# Altium schematic symbol library Regulator_Switching.SchLib: 1070 symbols (part 8 of 9)
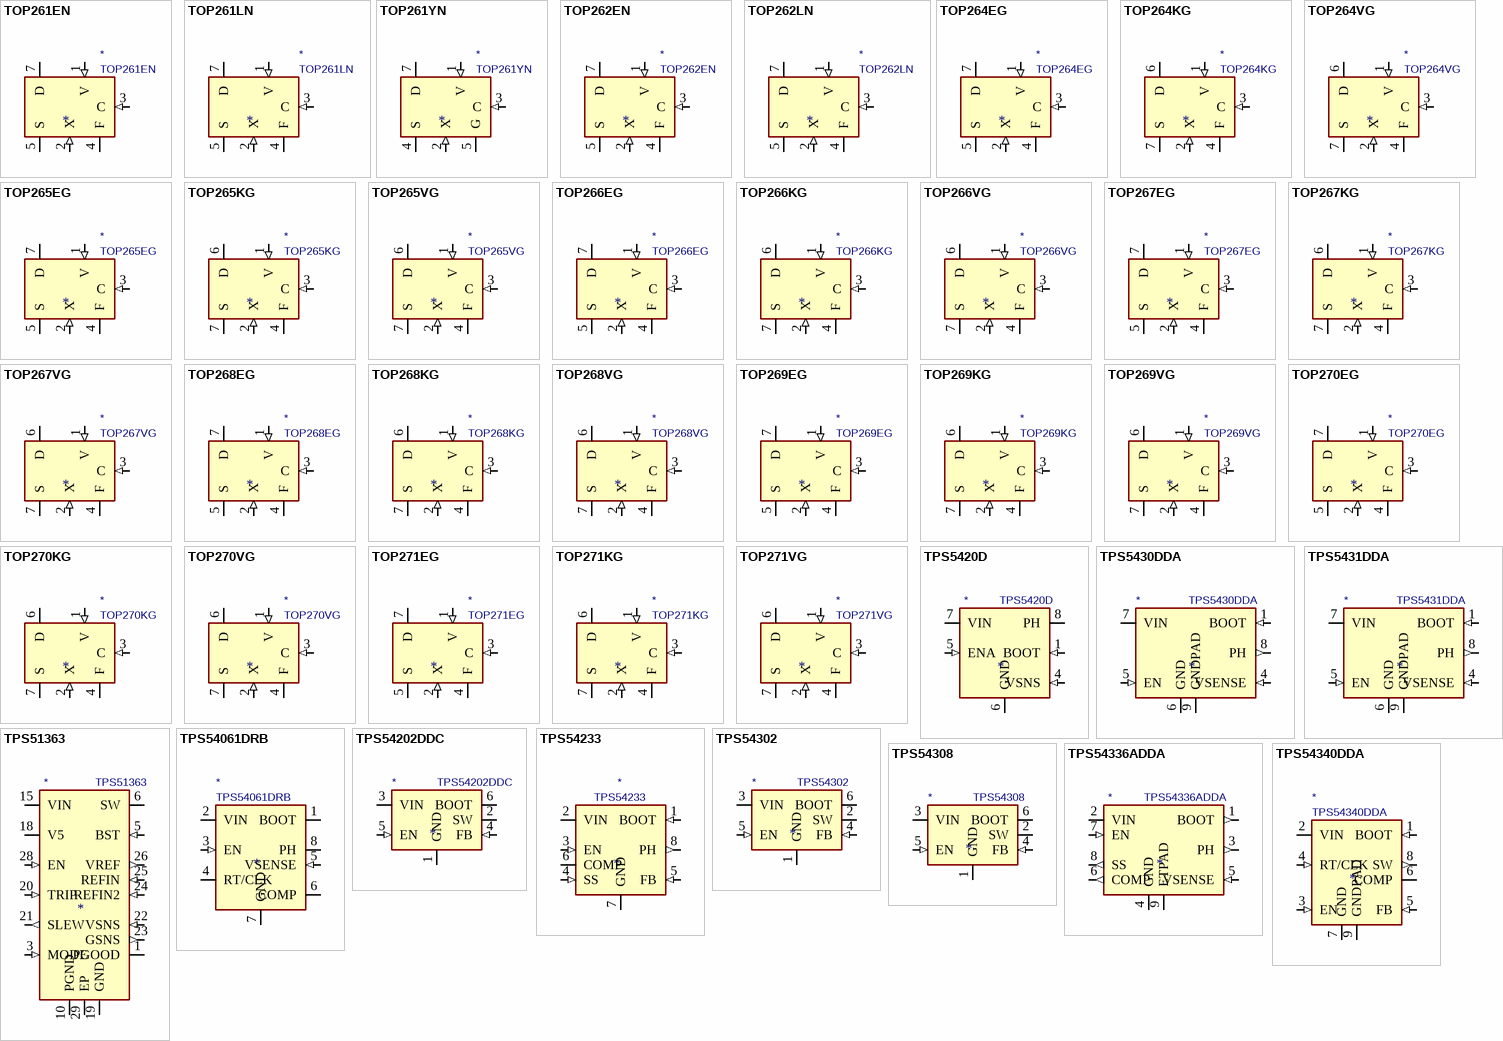
[diagram p33: symbols TOP261EN to TPS54340DDA]

## TOP262EN
designator *  value TOP262EN
ki_keywords: Eco Smart Off-Line Switcher, Extendend Power Range; ki_description: TOPSwitch-HX Family, 254W Output Power; ki_fp_filters: PowerIntegrations?eSIP?7C*; Footprint: Package_SIP:PowerIntegrations_eSIP-7C; Supplier: https://ac-dc.power.com/sites/default/files/product-docs/topswitch-hx_family_datasheet.pdf
footprint PowerIntegrations_eSIP-7C
pins: 1 V (in), 2 X (in), 3 C (in), 4 F, 5 S (power), 7 D (oc)

## TOP262LN
designator *  value TOP262LN
ki_keywords: Eco Smart Off-Line Switcher, Extendend Power Range; ki_description: TOPSwitch-HX Family, 177W Output Power; ki_fp_filters: PowerIntegrations?eSIP?7F*; Footprint: Package_SIP:PowerIntegrations_eSIP-7F; Supplier: https://ac-dc.power.com/sites/default/files/product-docs/topswitch-hx_family_datasheet.pdf
footprint PowerIntegrations_eSIP-7F
pins: 1 V (in), 2 X (in), 3 C (in), 4 F, 5 S (power), 7 D (oc)

## TOP264EG
designator *  value TOP264EG
ki_keywords: Integrated Off-Line Switcher with EcoSmart™ Technology; ki_description: TOPSwitch-JX Family, 43W Output Power, eSIP-7C; ki_fp_filters: PowerIntegrations?eSIP?7C*; Footprint: Package_SIP:PowerIntegrations_eSIP-7C; Supplier: https://ac-dc.power.com/sites/default/files/product-docs/topswitch-jx_family_datasheet.pdf
footprint PowerIntegrations_eSIP-7C
pins: 1 V (in), 2 X (in), 3 C (in), 4 F, 5 S (power), 7 D (oc)

## TOP264KG
designator *  value TOP264KG
ki_keywords: Integrated Off-Line Switcher with EcoSmart™ Technology; ki_description: TOPSwitch-JX Family, 30W Output Power, eSOP-12B; ki_fp_filters: PowerIntegrations?eSOP?12B*; Footprint: Package_SO:PowerIntegrations_eSOP-12B; Supplier: https://ac-dc.power.com/sites/default/files/product-docs/topswitch-jx_family_datasheet.pdf
footprint PowerIntegrations_eSOP-12B
pins: 1 V (in), 2 X (in), 3 C (in), 4 F, 6 D (oc), 7 S (power), 8 S hidden, 9 S hidden, 10 S hidden, 11 S hidden, 12 S hidden

## TOP264VG
designator *  value TOP264VG
ki_keywords: Integrated Off-Line Switcher with EcoSmart™ Technology; ki_description: TOPSwitch-JX Family, 43W Output Power, eDIP-12B; ki_fp_filters: PowerIntegrations?eDIP?12*; Footprint: Package_DIP:PowerIntegrations_eDIP-12B; Supplier: https://ac-dc.power.com/sites/default/files/product-docs/topswitch-jx_family_datasheet.pdf
footprint PowerIntegrations_eDIP-12B
pins: 1 V (in), 2 X (in), 3 C (in), 4 F, 6 D (oc), 7 S (power), 8 S hidden, 9 S hidden, 10 S hidden, 11 S hidden, 12 S hidden

## TOP265EG
designator *  value TOP265EG
ki_keywords: Integrated Off-Line Switcher with EcoSmart™ Technology; ki_description: TOPSwitch-JX Family, 57W Output Power, eSIP-7C; ki_fp_filters: PowerIntegrations?eSIP?7C*; Footprint: Package_SIP:PowerIntegrations_eSIP-7C; Supplier: https://ac-dc.power.com/sites/default/files/product-docs/topswitch-jx_family_datasheet.pdf
footprint PowerIntegrations_eSIP-7C
pins: 1 V (in), 2 X (in), 3 C (in), 4 F, 5 S (power), 7 D (oc)

## TOP265KG
designator *  value TOP265KG
ki_keywords: Integrated Off-Line Switcher with EcoSmart™ Technology; ki_description: TOPSwitch-JX Family, 34W Output Power, eSOP-12B; ki_fp_filters: PowerIntegrations?eSOP?12B*; Footprint: Package_SO:PowerIntegrations_eSOP-12B; Supplier: https://ac-dc.power.com/sites/default/files/product-docs/topswitch-jx_family_datasheet.pdf
footprint PowerIntegrations_eSOP-12B
pins: 1 V (in), 2 X (in), 3 C (in), 4 F, 6 D (oc), 7 S (power), 8 S hidden, 9 S hidden, 10 S hidden, 11 S hidden, 12 S hidden

## TOP265VG
designator *  value TOP265VG
ki_keywords: Integrated Off-Line Switcher with EcoSmart™ Technology; ki_description: TOPSwitch-JX Family, 57W Output Power, eDIP-12B; ki_fp_filters: PowerIntegrations?eDIP?12*; Footprint: Package_DIP:PowerIntegrations_eDIP-12B; Supplier: https://ac-dc.power.com/sites/default/files/product-docs/topswitch-jx_family_datasheet.pdf
footprint PowerIntegrations_eDIP-12B
pins: 1 V (in), 2 X (in), 3 C (in), 4 F, 6 D (oc), 7 S (power), 8 S hidden, 9 S hidden, 10 S hidden, 11 S hidden, 12 S hidden

## TOP266EG
designator *  value TOP266EG
ki_keywords: Integrated Off-Line Switcher with EcoSmart™ Technology; ki_description: TOPSwitch-JX Family, 86W Output Power, eSIP-7C; ki_fp_filters: PowerIntegrations?eSIP?7C*; Footprint: Package_SIP:PowerIntegrations_eSIP-7C; Supplier: https://ac-dc.power.com/sites/default/files/product-docs/topswitch-jx_family_datasheet.pdf
footprint PowerIntegrations_eSIP-7C
pins: 1 V (in), 2 X (in), 3 C (in), 4 F, 5 S (power), 7 D (oc)

## TOP266KG
designator *  value TOP266KG
ki_keywords: Integrated Off-Line Switcher with EcoSmart™ Technology; ki_description: TOPSwitch-JX Family, 39W Output Power, eSOP-12B; ki_fp_filters: PowerIntegrations?eSOP?12B*; Footprint: Package_SO:PowerIntegrations_eSOP-12B; Supplier: https://ac-dc.power.com/sites/default/files/product-docs/topswitch-jx_family_datasheet.pdf
footprint PowerIntegrations_eSOP-12B
pins: 1 V (in), 2 X (in), 3 C (in), 4 F, 6 D (oc), 7 S (power), 8 S hidden, 9 S hidden, 10 S hidden, 11 S hidden, 12 S hidden

## TOP266VG
designator *  value TOP266VG
ki_keywords: Integrated Off-Line Switcher with EcoSmart™ Technology; ki_description: TOPSwitch-JX Family, 86W Output Power, eDIP-12B; ki_fp_filters: PowerIntegrations?eDIP?12*; Footprint: Package_DIP:PowerIntegrations_eDIP-12B; Supplier: https://ac-dc.power.com/sites/default/files/product-docs/topswitch-jx_family_datasheet.pdf
footprint PowerIntegrations_eDIP-12B
pins: 1 V (in), 2 X (in), 3 C (in), 4 F, 6 D (oc), 7 S (power), 8 S hidden, 9 S hidden, 10 S hidden, 11 S hidden, 12 S hidden

## TOP267EG
designator *  value TOP267EG
ki_keywords: Integrated Off-Line Switcher with EcoSmart™ Technology; ki_description: TOPSwitch-JX Family, 103W Output Power, eSIP-7C; ki_fp_filters: PowerIntegrations?eSIP?7C*; Footprint: Package_SIP:PowerIntegrations_eSIP-7C; Supplier: https://ac-dc.power.com/sites/default/files/product-docs/topswitch-jx_family_datasheet.pdf
footprint PowerIntegrations_eSIP-7C
pins: 1 V (in), 2 X (in), 3 C (in), 4 F, 5 S (power), 7 D (oc)

## TOP267KG
designator *  value TOP267KG
ki_keywords: Integrated Off-Line Switcher with EcoSmart™ Technology; ki_description: TOPSwitch-JX Family, 45W Output Power, eSOP-12B; ki_fp_filters: PowerIntegrations?eSOP?12B*; Footprint: Package_SO:PowerIntegrations_eSOP-12B; Supplier: https://ac-dc.power.com/sites/default/files/product-docs/topswitch-jx_family_datasheet.pdf
footprint PowerIntegrations_eSOP-12B
pins: 1 V (in), 2 X (in), 3 C (in), 4 F, 6 D (oc), 7 S (power), 8 S hidden, 9 S hidden, 10 S hidden, 11 S hidden, 12 S hidden

## TOP267VG
designator *  value TOP267VG
ki_keywords: Integrated Off-Line Switcher with EcoSmart™ Technology; ki_description: TOPSwitch-JX Family, 103W Output Power, eDIP-12B; ki_fp_filters: PowerIntegrations?eDIP?12*; Footprint: Package_DIP:PowerIntegrations_eDIP-12B; Supplier: https://ac-dc.power.com/sites/default/files/product-docs/topswitch-jx_family_datasheet.pdf
footprint PowerIntegrations_eDIP-12B
pins: 1 V (in), 2 X (in), 3 C (in), 4 F, 6 D (oc), 7 S (power), 8 S hidden, 9 S hidden, 10 S hidden, 11 S hidden, 12 S hidden

## TOP268EG
designator *  value TOP268EG
ki_keywords: Integrated Off-Line Switcher with EcoSmart™ Technology; ki_description: TOPSwitch-JX Family, 112W Output Power, eSIP-7C; ki_fp_filters: PowerIntegrations?eSIP?7C*; Footprint: Package_SIP:PowerIntegrations_eSIP-7C; Supplier: https://ac-dc.power.com/sites/default/files/product-docs/topswitch-jx_family_datasheet.pdf
footprint PowerIntegrations_eSIP-7C
pins: 1 V (in), 2 X (in), 3 C (in), 4 F, 5 S (power), 7 D (oc)

## TOP268KG
designator *  value TOP268KG
ki_keywords: Integrated Off-Line Switcher with EcoSmart™ Technology; ki_description: TOPSwitch-JX Family, 50W Output Power, eSOP-12B; ki_fp_filters: PowerIntegrations?eSOP?12B*; Footprint: Package_SO:PowerIntegrations_eSOP-12B; Supplier: https://ac-dc.power.com/sites/default/files/product-docs/topswitch-jx_family_datasheet.pdf
footprint PowerIntegrations_eSOP-12B
pins: 1 V (in), 2 X (in), 3 C (in), 4 F, 6 D (oc), 7 S (power), 8 S hidden, 9 S hidden, 10 S hidden, 11 S hidden, 12 S hidden

## TOP268VG
designator *  value TOP268VG
ki_keywords: Integrated Off-Line Switcher with EcoSmart™ Technology; ki_description: TOPSwitch-JX Family, 112W Output Power, eDIP-12B; ki_fp_filters: PowerIntegrations?eDIP?12*; Footprint: Package_DIP:PowerIntegrations_eDIP-12B; Supplier: https://ac-dc.power.com/sites/default/files/product-docs/topswitch-jx_family_datasheet.pdf
footprint PowerIntegrations_eDIP-12B
pins: 1 V (in), 2 X (in), 3 C (in), 4 F, 6 D (oc), 7 S (power), 8 S hidden, 9 S hidden, 10 S hidden, 11 S hidden, 12 S hidden

## TOP269EG
designator *  value TOP269EG
ki_keywords: Integrated Off-Line Switcher with EcoSmart™ Technology; ki_description: TOPSwitch-JX Family, 120W Output Power, eSIP-7C; ki_fp_filters: PowerIntegrations?eSIP?7C*; Footprint: Package_SIP:PowerIntegrations_eSIP-7C; Supplier: https://ac-dc.power.com/sites/default/files/product-docs/topswitch-jx_family_datasheet.pdf
footprint PowerIntegrations_eSIP-7C
pins: 1 V (in), 2 X (in), 3 C (in), 4 F, 5 S (power), 7 D (oc)

## TOP269KG
designator *  value TOP269KG
ki_keywords: Integrated Off-Line Switcher with EcoSmart™ Technology; ki_description: TOPSwitch-JX Family, 55W Output Power, eSOP-12B; ki_fp_filters: PowerIntegrations?eSOP?12B*; Footprint: Package_SO:PowerIntegrations_eSOP-12B; Supplier: https://ac-dc.power.com/sites/default/files/product-docs/topswitch-jx_family_datasheet.pdf
footprint PowerIntegrations_eSOP-12B
pins: 1 V (in), 2 X (in), 3 C (in), 4 F, 6 D (oc), 7 S (power), 8 S hidden, 9 S hidden, 10 S hidden, 11 S hidden, 12 S hidden

## TOP269VG
designator *  value TOP269VG
ki_keywords: Integrated Off-Line Switcher with EcoSmart™ Technology; ki_description: TOPSwitch-JX Family, 120W Output Power, eDIP-12B; ki_fp_filters: PowerIntegrations?eDIP?12*; Footprint: Package_DIP:PowerIntegrations_eDIP-12B; Supplier: https://ac-dc.power.com/sites/default/files/product-docs/topswitch-jx_family_datasheet.pdf
footprint PowerIntegrations_eDIP-12B
pins: 1 V (in), 2 X (in), 3 C (in), 4 F, 6 D (oc), 7 S (power), 8 S hidden, 9 S hidden, 10 S hidden, 11 S hidden, 12 S hidden

## TOP270EG
designator *  value TOP270EG
ki_keywords: Integrated Off-Line Switcher with EcoSmart™ Technology; ki_description: TOPSwitch-JX Family, 140W Output Power, eSIP-7C; ki_fp_filters: PowerIntegrations?eSIP?7C*; Footprint: Package_SIP:PowerIntegrations_eSIP-7C; Supplier: https://ac-dc.power.com/sites/default/files/product-docs/topswitch-jx_family_datasheet.pdf
footprint PowerIntegrations_eSIP-7C
pins: 1 V (in), 2 X (in), 3 C (in), 4 F, 5 S (power), 7 D (oc)

## TOP270KG
designator *  value TOP270KG
ki_keywords: Integrated Off-Line Switcher with EcoSmart™ Technology; ki_description: TOPSwitch-JX Family, 60W Output Power, eSOP-12B; ki_fp_filters: PowerIntegrations?eSOP?12B*; Footprint: Package_SO:PowerIntegrations_eSOP-12B; Supplier: https://ac-dc.power.com/sites/default/files/product-docs/topswitch-jx_family_datasheet.pdf
footprint PowerIntegrations_eSOP-12B
pins: 1 V (in), 2 X (in), 3 C (in), 4 F, 6 D (oc), 7 S (power), 8 S hidden, 9 S hidden, 10 S hidden, 11 S hidden, 12 S hidden

## TOP270VG
designator *  value TOP270VG
ki_keywords: Integrated Off-Line Switcher with EcoSmart™ Technology; ki_description: TOPSwitch-JX Family, 140W Output Power, eDIP-12B; ki_fp_filters: PowerIntegrations?eDIP?12*; Footprint: Package_DIP:PowerIntegrations_eDIP-12B; Supplier: https://ac-dc.power.com/sites/default/files/product-docs/topswitch-jx_family_datasheet.pdf
footprint PowerIntegrations_eDIP-12B
pins: 1 V (in), 2 X (in), 3 C (in), 4 F, 6 D (oc), 7 S (power), 8 S hidden, 9 S hidden, 10 S hidden, 11 S hidden, 12 S hidden

## TOP271EG
designator *  value TOP271EG
ki_keywords: Integrated Off-Line Switcher with EcoSmart™ Technology; ki_description: TOPSwitch-JX Family, 177W Output Power, eSIP-7C; ki_fp_filters: PowerIntegrations?eSIP?7C*; Footprint: Package_SIP:PowerIntegrations_eSIP-7C; Supplier: https://ac-dc.power.com/sites/default/files/product-docs/topswitch-jx_family_datasheet.pdf
footprint PowerIntegrations_eSIP-7C
pins: 1 V (in), 2 X (in), 3 C (in), 4 F, 5 S (power), 7 D (oc)

## TOP271KG
designator *  value TOP271KG
ki_keywords: Integrated Off-Line Switcher with EcoSmart™ Technology; ki_description: TOPSwitch-JX Family, 66W Output Power, eSOP-12B; ki_fp_filters: PowerIntegrations?eSOP?12B*; Footprint: Package_SO:PowerIntegrations_eSOP-12B; Supplier: https://ac-dc.power.com/sites/default/files/product-docs/topswitch-jx_family_datasheet.pdf
footprint PowerIntegrations_eSOP-12B
pins: 1 V (in), 2 X (in), 3 C (in), 4 F, 6 D (oc), 7 S (power), 8 S hidden, 9 S hidden, 10 S hidden, 11 S hidden, 12 S hidden

## TOP271VG
designator *  value TOP271VG
ki_keywords: Integrated Off-Line Switcher with EcoSmart™ Technology; ki_description: TOPSwitch-JX Family, 177W Output Power, eDIP-12B; ki_fp_filters: PowerIntegrations?eDIP?12*; Footprint: Package_DIP:PowerIntegrations_eDIP-12B; Supplier: https://ac-dc.power.com/sites/default/files/product-docs/topswitch-jx_family_datasheet.pdf
footprint PowerIntegrations_eDIP-12B
pins: 1 V (in), 2 X (in), 3 C (in), 4 F, 6 D (oc), 7 S (power), 8 S hidden, 9 S hidden, 10 S hidden, 11 S hidden, 12 S hidden

## TPS5420D
designator *  value TPS5420D
ki_keywords: switching buck converter step-down; ki_description: Adjustable Output, 2A Step-Down Converter, 5.5V-36V Input, 500kHz Switching Frequency; ki_fp_filters: SOIC*3.9x4.9mm*P1.27mm*; Footprint: Package_SO:SOIC-8_3.9x4.9mm_P1.27mm; Supplier: http://www.ti.com/lit/ds/symlink/tps5420.pdf
footprint SOIC-8_3.9x4.9mm_P1.27mm
pins: 1 BOOT (in), 2 NC (in) hidden, 3 NC (in) hidden, 4 VSNS (in), 5 ENA (in), 6 GND (power), 7 VIN (power), 8 PH (power)

## TPS5430DDA
designator *  value TPS5430DDA
ki_keywords: Step-Down DC-DC Switching Regulator; ki_description: 3A, Step Down Swift Converter, Adjustable Output Voltage, 5.5-36V Input Voltage, PowerSO-8; ki_fp_filters: TI*SO*PowerPAD*ThermalVias*; Footprint: Package_SO:TI_SO-PowerPAD-8_ThermalVias; Supplier: http://www.ti.com/lit/ds/symlink/tps5430.pdf
footprint TI_SO-PowerPAD-8_ThermalVias
pins: 1 BOOT (in), 2 NC (in) hidden, 3 NC (in) hidden, 4 VSENSE (in), 5 EN (in), 6 GND (power), 7 VIN (power), 8 PH (out), 9 GNDPAD (power)

## TPS5431DDA
designator *  value TPS5431DDA
ki_keywords: Step-Down DC-DC Switching Regulator; ki_description: 3A, Step Down Swift Converter, Adjustable Output Voltage, 5.5-23V Input Voltage, PowerSO-8; ki_fp_filters: TI*SO*PowerPAD*ThermalVias*; Footprint: Package_SO:TI_SO-PowerPAD-8_ThermalVias; Supplier: http://www.ti.com/lit/ds/symlink/tps5430.pdf
footprint TI_SO-PowerPAD-8_ThermalVias
pins: 1 BOOT (in), 2 NC (in) hidden, 3 NC (in) hidden, 4 VSENSE (in), 5 EN (in), 6 GND (power), 7 VIN (power), 8 PH (out), 9 GNDPAD (power)

## TPS51363
designator *  value TPS51363
ki_keywords: Step-down; ki_description: High-voltage input, synchronous converter with integrated FET, QFN-28; ki_fp_filters: *QFN*EP2.1x3.1mm*; Footprint: Package_DFN_QFN:Texas_R-PWQFN-N28_EP2.1x3.1mm; Supplier: http://www.ti.com/lit/ds/symlink/tps51363.pdf
footprint Texas_R-PWQFN-N28_EP2.1x3.1mm
pins: 1 PGOOD (oc), 2 NU (in) hidden, 3 MODE (in), 4 NC (in) hidden, 5 BST (in), 6 SW (power), 7 SW hidden, 8 SW hidden, 9 SW hidden, 10 PGND (power), 11 PGND hidden, 12 PGND hidden, 13 PGND hidden, 14 PGND hidden, 15 VIN (power), 16 VIN hidden, 17 VIN hidden, 18 V5 (power), 19 GND (power), 20 TRIP (in), 21 SLEW (out), 22 VSNS (in), 23 GSNS (out), 24 REFIN2 (in), 25 REFIN (in), 26 VREF (out), 27 NU (in) hidden, 28 EN (in), 29 EP (power)

## TPS54061DRB
designator *  value TPS54061DRB
ki_keywords: Step-Down DC-DC Switching Regulator High Voltage Adjustable Frequency; ki_description: 0.2A, Step Down DC-DC Converter with Low IQ, 4.5-60V Input Voltage, VSON-8; ki_fp_filters: Texas*S*PVSON*; Footprint: Package_SON:Texas_S-PVSON-N8; Supplier: http://www.ti.com/lit/ds/symlink/tps54061.pdf
footprint Texas_S-PVSON-N8
pins: 1 BOOT, 2 VIN (power), 3 EN (in), 4 RT/CLK, 5 VSENSE (in), 6 COMP, 7 GND (power), 8 PH (power), 9 GND hidden

## TPS54202DDC
designator *  value TPS54202DDC
ki_keywords: switching buck converter power-supply voltage regulator emi spread spectrum; ki_description: 2A, 4.5 to 28V Input, EMI Friendly integrated switch synchronous step-down regulator, pulse-skipping, SOT-23-6; ki_fp_filters: SOT?23*; Footprint: Package_TO_SOT_SMD:SOT-23-6; Supplier: http://www.ti.com/lit/ds/symlink/tps54202.pdf
footprint SOT-23-6
pins: 1 GND (power), 2 SW (power), 3 VIN (power), 4 FB (in), 5 EN (in), 6 BOOT

## TPS54233
designator *  value TPS54233
ki_keywords: Step-Down DC-DC Switching Regulator High Voltage High Frequency; ki_description: 2A, Step Down DC-DC Converter with Eco-mode, 3.5-28V Input Voltage, SO-8; ki_fp_filters: SOIC*3.9x4.9mm*; Footprint: Package_SO:SOIC-8_3.9x4.9mm_P1.27mm; Supplier: http://www.ti.com/lit/ds/symlink/tps54233.pdf
footprint SOIC-8_3.9x4.9mm_P1.27mm
pins: 1 BOOT (in), 2 VIN (power), 3 EN (in), 4 SS (in), 5 FB (in), 6 COMP, 7 GND (power), 8 PH (out)

## TPS54302
designator *  value TPS54302
ki_keywords: switching buck converter power-supply voltage regulator emi spread spectrum; ki_description: 3A, 4.5 to 28V Input, EMI Friendly integrated switch synchronous step-down regulator, pulse-skipping, SOT-23-6; ki_fp_filters: SOT?23*; Footprint: Package_TO_SOT_SMD:SOT-23-6; Supplier: http://www.ti.com/lit/ds/symlink/tps54302.pdf
footprint SOT-23-6
pins: 1 GND (power), 2 SW (power), 3 VIN (power), 4 FB (in), 5 EN (in), 6 BOOT

## TPS54308
designator *  value TPS54308
ki_keywords: switching buck converter power-supply voltage regulator emi spread spectrum FCCM; ki_description: 3A, 4.5 to 28V Input, EMI Friendly integrated switch synchronous step-down regulator, continuous-conduction, SOT-23-6; ki_fp_filters: SOT?23*; Footprint: Package_TO_SOT_SMD:SOT-23-6; Supplier: http://www.ti.com/lit/ds/symlink/tps54308.pdf
footprint SOT-23-6
pins: 1 GND (power), 2 SW (power), 3 VIN (power), 4 FB (in), 5 EN (in), 6 BOOT

## TPS54336ADDA
designator *  value TPS54336ADDA
ki_keywords: Step-Down DC-DC Switching Regulator; ki_description: 4.5V to 28V Input, 3A, Synchronous Step-Down Converter with Eco-mode(tm); ki_fp_filters: TI*SO*PowerPAD*ThermalVias*; Footprint: Package_SO:TI_SO-PowerPAD-8_ThermalVias; Supplier: http://www.ti.com/lit/ds/symlink/tps54336a.pdf
footprint TI_SO-PowerPAD-8_ThermalVias
pins: 1 BOOT (out), 2 VIN (power), 3 PH (out), 4 GND (power), 5 VSENSE (in), 6 COMP (out), 7 EN (in), 8 SS (out), 9 ETPAD (power)

## TPS54340DDA
designator *  value TPS54340DDA
ki_keywords: Step-Down DC-DC Switching Regulator High Voltage High Frequency; ki_description: 3.5A, Step Down DC-DC Converter with Eco-mode, 4.5-42V Input Voltage, PowerSO-8; ki_fp_filters: TI*SO*PowerPAD*ThermalVias*; Footprint: Package_SO:TI_SO-PowerPAD-8_ThermalVias; Supplier: http://www.ti.com/lit/ds/symlink/tps54340.pdf
footprint TI_SO-PowerPAD-8_ThermalVias
pins: 1 BOOT (in), 2 VIN (power), 3 EN (in), 4 RT/CLK (in), 5 FB (in), 6 COMP, 7 GND (power), 8 SW (out), 9 GNDPAD (power)

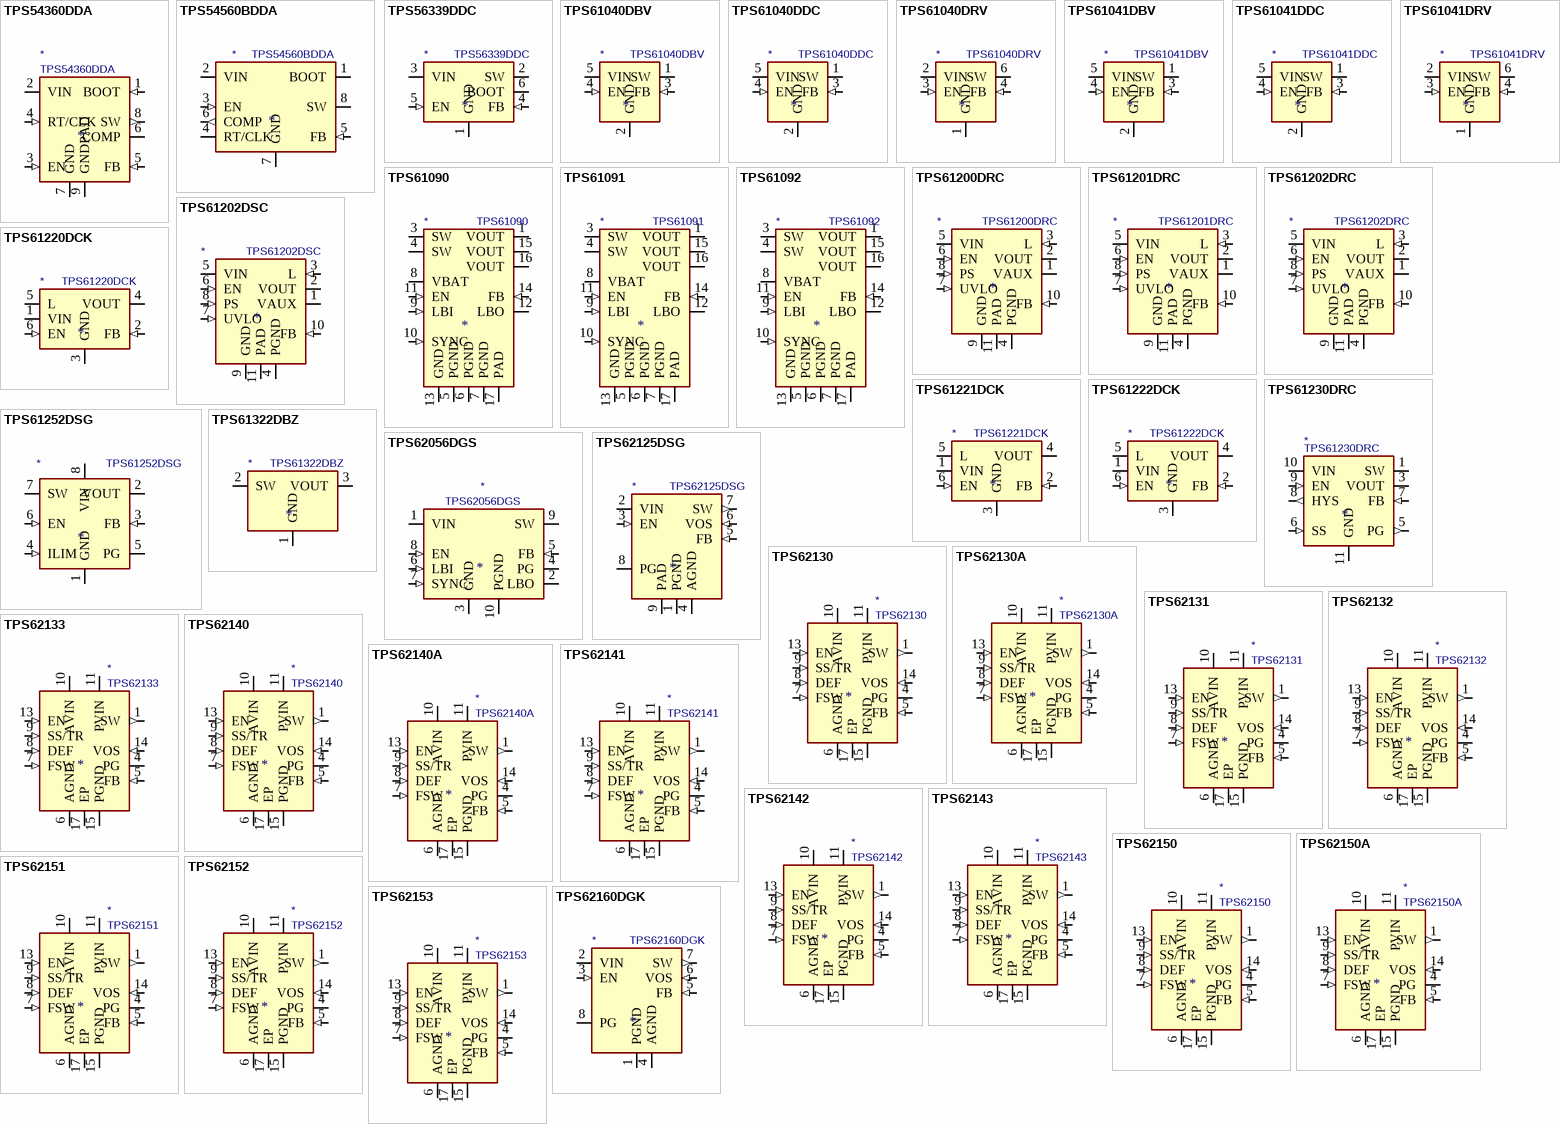
[diagram p24: symbols TPS54360DDA to TPS62160DGK]

## TPS54360DDA
designator *  value TPS54360DDA
ki_keywords: Step-Down DC-DC Switching Regulator High Voltage High Frequency; ki_description: 3.5A, Step Down DC-DC Converter with Eco-mode, 4.5-60V Input Voltage, PowerSO-8; ki_fp_filters: TI*SO*PowerPAD*ThermalVias*; Footprint: Package_SO:TI_SO-PowerPAD-8_ThermalVias; Supplier: http://www.ti.com/lit/ds/symlink/tps54360.pdf
footprint TI_SO-PowerPAD-8_ThermalVias
pins: 1 BOOT (in), 2 VIN (power), 3 EN (in), 4 RT/CLK (in), 5 FB (in), 6 COMP, 7 GND (power), 8 SW (out), 9 GNDPAD (power)

## TPS54560BDDA
designator *  value TPS54560BDDA
ki_keywords: buck controller; ki_description: 5A, Step Down DC-DC Converter, 4.5-60V Input Voltage, Texas R-PDSO-G8; ki_fp_filters: Texas*R*PDSO*G8*; Footprint: Package_SO:Texas_R-PDSO-G8_EP2.95x4.9mm_Mask2.4x3.1mm_ThermalVias; Supplier: https://www.ti.com/lit/ds/symlink/tps54560b.pdf
footprint Texas_R-PDSO-G8_EP2.95x4.9mm_Mask2.4x3.1mm_ThermalVias
pins: 1 BOOT, 2 VIN (power), 3 EN (in), 4 RT/CLK, 5 FB (in), 6 COMP (out), 7 GND (power), 8 SW (power), 9 GND hidden

## TPS56339DDC
designator *  value TPS56339DDC
ki_keywords: step-down dcdc voltage regulator; ki_description: 4.5V to 24V Input, 3-A Output Synchronous Buck Converter, SOT-23-6; ki_fp_filters: SOT?23*; Footprint: Package_TO_SOT_SMD:SOT-23-6; Supplier: https://www.ti.com/lit/ds/symlink/tps56339.pdf
footprint SOT-23-6
pins: 1 GND (power), 2 SW (power), 3 VIN (power), 4 FB (in), 5 EN (in), 6 BOOT

## TPS61040DBV
designator *  value TPS61040DBV
ki_keywords: Step-Up Boost DC-DC Regulator Adjustable; ki_description: Synchronous Boost Regulator, Adjustable Output up to 28V, 400 mA Switch Current Limit, SOT-23-5; ki_fp_filters: SOT?23*; Footprint: Package_TO_SOT_SMD:SOT-23-5; Supplier: http://www.ti.com/lit/ds/symlink/tps61040.pdf
footprint SOT-23-5
pins: 1 SW (power), 2 GND (power), 3 FB (in), 4 EN (in), 5 VIN (power)

## TPS61040DDC
designator *  value TPS61040DDC
ki_keywords: Step-Up Boost DC-DC Regulator Adjustable; ki_description: Synchronous Boost Regulator, Adjustable Output up to 28V, 400 mA Switch Current Limit, SOT-23-5; ki_fp_filters: SOT?23*; Footprint: Package_TO_SOT_SMD:SOT-23-5; Supplier: https://www.ti.com/lit/ds/symlink/tps61040.pdf
footprint SOT-23-5
pins: 1 SW (power), 2 GND (power), 3 FB (in), 4 EN (in), 5 VIN (power)

## TPS61040DRV
designator *  value TPS61040DRV
ki_keywords: Step-Up Boost DC-DC Regulator Adjustable; ki_description: Synchronous Boost Regulator, Adjustable Output up to 28V, 400 mA Switch Current Limit, WSON-6; ki_fp_filters: WSON*1EP*2x2mm*P0.65mm*; Footprint: Package_SON:WSON-6-1EP_2x2mm_P0.65mm_EP1x1.6mm; Supplier: https://www.ti.com/lit/ds/symlink/tps61040.pdf
footprint WSON-6-1EP_2x2mm_P0.65mm_EP1x1.6mm
pins: 1 GND (power), 2 VIN (power), 3 EN (in), 4 FB (in), 5 NC (in) hidden, 6 SW (power)

## TPS61041DBV
designator *  value TPS61041DBV
ki_keywords: Step-Up Boost DC-DC Regulator Adjustable; ki_description: Synchronous Boost Regulator, Adjustable Output up to 28V, 250 mA Switch Current Limit, SOT-23-5; ki_fp_filters: SOT?23*; Footprint: Package_TO_SOT_SMD:SOT-23-5; Supplier: http://www.ti.com/lit/ds/symlink/tps61040.pdf
footprint SOT-23-5
pins: 1 SW (power), 2 GND (power), 3 FB (in), 4 EN (in), 5 VIN (power)

## TPS61041DDC
designator *  value TPS61041DDC
ki_keywords: Step-Up Boost DC-DC Regulator Adjustable; ki_description: Synchronous Boost Regulator, Adjustable Output up to 28V, 250 mA Switch Current Limit, SOT-23-5; ki_fp_filters: SOT?23*; Footprint: Package_TO_SOT_SMD:SOT-23-5; Supplier: http://www.ti.com/lit/ds/symlink/tps61040.pdf
footprint SOT-23-5
pins: 1 SW (power), 2 GND (power), 3 FB (in), 4 EN (in), 5 VIN (power)

## TPS61041DRV
designator *  value TPS61041DRV
ki_keywords: Step-Up Boost DC-DC Regulator Adjustable; ki_description: Synchronous Boost Regulator, Adjustable Output up to 28V, 250 mA Switch Current Limit, WSON-6; ki_fp_filters: WSON*1EP*2x2mm*P0.65mm*; Footprint: Package_SON:WSON-6-1EP_2x2mm_P0.65mm_EP1x1.6mm; Supplier: http://www.ti.com/lit/ds/symlink/tps61040.pdf
footprint WSON-6-1EP_2x2mm_P0.65mm_EP1x1.6mm
pins: 1 GND (power), 2 VIN (power), 3 EN (in), 4 FB (in), 5 NC (in) hidden, 6 SW (power)

## TPS61090
designator *  value TPS61090
ki_keywords: Adjustable 2A battery boost converter; ki_description: 2A Step-Up DC-DC Converter for Batteries, Isw up to 2500mA, Adjustable output voltage, QFN-16; ki_fp_filters: Texas*S?PVQFN?N*; Footprint: Package_DFN_QFN:Texas_S-PVQFN-N16_EP2.7x2.7mm_ThermalVias; Supplier: http://www.ti.com/lit/ds/symlink/tps61090.pdf
footprint Texas_S-PVQFN-N16_EP2.7x2.7mm_ThermalVias
pins: 1 VOUT (power), 2 NC (in) hidden, 3 SW, 4 SW, 5 PGND (power), 6 PGND (power), 7 PGND (power), 8 VBAT (power), 9 LBI (in), 10 SYNC (in), 11 EN (in), 12 LBO (oc), 13 GND (power), 14 FB (in), 15 VOUT, 16 VOUT, 17 PAD (power)

## TPS61091
designator *  value TPS61091
ki_keywords: Fixed 3.3V 2A battery boost converter; ki_description: 2A Step-Up DC-DC Converter for Batteries, Isw up to 2500mA, 3.3V Output Voltage, QFN-16; ki_fp_filters: Texas*S?PVQFN?N*; Footprint: Package_DFN_QFN:Texas_S-PVQFN-N16_EP2.7x2.7mm_ThermalVias; Supplier: http://www.ti.com/lit/ds/symlink/tps61090.pdf
footprint Texas_S-PVQFN-N16_EP2.7x2.7mm_ThermalVias
pins: 1 VOUT (power), 2 NC (in) hidden, 3 SW, 4 SW, 5 PGND (power), 6 PGND (power), 7 PGND (power), 8 VBAT (power), 9 LBI (in), 10 SYNC (in), 11 EN (in), 12 LBO (oc), 13 GND (power), 14 FB (in), 15 VOUT, 16 VOUT, 17 PAD (power)

## TPS61092
designator *  value TPS61092
ki_keywords: Fixed 5V 2A battery boost converter; ki_description: 2A Step-Up DC-DC Converter for Batteries, Isw up to 2500mA, 5V Output Voltage, QFN-16; ki_fp_filters: Texas*S?PVQFN?N*; Footprint: Package_DFN_QFN:Texas_S-PVQFN-N16_EP2.7x2.7mm_ThermalVias; Supplier: http://www.ti.com/lit/ds/symlink/tps61090.pdf
footprint Texas_S-PVQFN-N16_EP2.7x2.7mm_ThermalVias
pins: 1 VOUT (power), 2 NC (in) hidden, 3 SW, 4 SW, 5 PGND (power), 6 PGND (power), 7 PGND (power), 8 VBAT (power), 9 LBI (in), 10 SYNC (in), 11 EN (in), 12 LBO (oc), 13 GND (power), 14 FB (in), 15 VOUT, 16 VOUT, 17 PAD (power)

## TPS61200DRC
designator *  value TPS61200DRC
ki_keywords: boost step-up DC/DC synchronous; ki_description: Low Input Voltage Synchronous Boost Converter With 1.3A Switches, Adjustable Output Voltage, 0.3-5.5V Input Voltage, VSON-10; ki_fp_filters: Texas*S*PVSON*N10*ThermalVias*; Footprint: Package_SON:Texas_S-PVSON-N10_ThermalVias; Supplier: http://www.ti.com/lit/ds/symlink/tps61200.pdf
footprint Texas_S-PVSON-N10_ThermalVias
pins: 1 VAUX (io), 2 VOUT (power), 3 L (in), 4 PGND (power), 5 VIN (power), 6 EN (in), 7 UVLO (in), 8 PS (in), 9 GND (power), 10 FB (in), 11 PAD (power)

## TPS61201DRC
designator *  value TPS61201DRC
ki_keywords: boost step-up DC/DC synchronous; ki_description: Low Input Voltage Synchronous Boost Converter With 1.3A Switches, Fixed 5V Output Voltage, 0.3-5.5V Input Voltage, VSON-10; ki_fp_filters: Texas*S*PVSON*N10*ThermalVias*; Footprint: Package_SON:Texas_S-PVSON-N10_ThermalVias; Supplier: http://www.ti.com/lit/ds/symlink/tps61200.pdf
footprint Texas_S-PVSON-N10_ThermalVias
pins: 1 VAUX (io), 2 VOUT (power), 3 L (in), 4 PGND (power), 5 VIN (power), 6 EN (in), 7 UVLO (in), 8 PS (in), 9 GND (power), 10 FB (in), 11 PAD (power)

## TPS61202DRC
designator *  value TPS61202DRC
ki_keywords: boost step-up DC/DC synchronous; ki_description: Low Input Voltage Synchronous Boost Converter With 1.3A Switches, Fixed 5V Output Voltage, 0.3-5.5V Input Voltage, VSON-10; ki_fp_filters: Texas*S*PVSON*N10*ThermalVias*; Footprint: Package_SON:Texas_S-PVSON-N10_ThermalVias; Supplier: http://www.ti.com/lit/ds/symlink/tps61200.pdf
footprint Texas_S-PVSON-N10_ThermalVias
pins: 1 VAUX (io), 2 VOUT (power), 3 L (in), 4 PGND (power), 5 VIN (power), 6 EN (in), 7 UVLO (in), 8 PS (in), 9 GND (power), 10 FB (in), 11 PAD (power)

## TPS61202DSC
designator *  value TPS61202DSC
ki_keywords: boost step-up DC/DC synchronous; ki_description: Low Input Voltage Synchronous Boost Converter With 1.3A Switches, Fixed 5V Output Voltage, 0.3-5.5V Input Voltage, WSON-10; ki_fp_filters: Texas*DSC0010J*ThermalVias*; Footprint: Package_SON:Texas_DSC0010J_ThermalVias; Supplier: http://www.ti.com/lit/ds/symlink/tps61200.pdf
footprint Texas_DSC0010J_ThermalVias
pins: 1 VAUX (io), 2 VOUT (power), 3 L (in), 4 PGND (power), 5 VIN (power), 6 EN (in), 7 UVLO (in), 8 PS (in), 9 GND (power), 10 FB (in), 11 PAD (power)

## TPS61220DCK
designator *  value TPS61220DCK
ki_keywords: Boost adjustable converter; ki_description: 400 mA Step-Up Converter, Adjustable Output Voltage, 0.7-5.5V Input Voltage, SC-70; ki_fp_filters: Texas*R*PDSO*G6*; Footprint: Package_TO_SOT_SMD:Texas_R-PDSO-G6; Supplier: http://www.ti.com/lit/ds/symlink/tps61220.pdf
footprint Texas_R-PDSO-G6
pins: 1 VIN (power), 2 FB (in), 3 GND (power), 4 VOUT (power), 5 L (power), 6 EN (in)

## TPS61221DCK
designator *  value TPS61221DCK
ki_keywords: Boost adjustable converter; ki_description: 400 mA Step-Up Converter, Fixed 3.3V Output Voltage, 0.7-5.5V Input Voltage, SC-70; ki_fp_filters: Texas*R*PDSO*G6*; Footprint: Package_TO_SOT_SMD:Texas_R-PDSO-G6; Supplier: http://www.ti.com/lit/ds/symlink/tps61220.pdf
footprint Texas_R-PDSO-G6
pins: 1 VIN (power), 2 FB (in), 3 GND (power), 4 VOUT (power), 5 L (power), 6 EN (in)

## TPS61222DCK
designator *  value TPS61222DCK
ki_keywords: Boost adjustable converter; ki_description: 400 mA Step-Up Converter, Fixed 5V Output Voltage, 0.7-5.5V Input Voltage, SC-70; ki_fp_filters: Texas*R*PDSO*G6*; Footprint: Package_TO_SOT_SMD:Texas_R-PDSO-G6; Supplier: http://www.ti.com/lit/ds/symlink/tps61220.pdf
footprint Texas_R-PDSO-G6
pins: 1 VIN (power), 2 FB (in), 3 GND (power), 4 VOUT (power), 5 L (power), 6 EN (in)

## TPS61230DRC
designator *  value TPS61230DRC
ki_keywords: boost converter switching adjustable 5A-switch VSON-10; ki_description: High Efficiency Synchronous Step Up Converters with 5-A Switches, 2.3-5.5V Input Voltage, VSON-10; ki_fp_filters: Texas*S*PVSON*N10*; Footprint: Package_SON:Texas_S-PVSON-N10_ThermalVias; Supplier: http://www.ti.com/lit/ds/symlink/tps61232.pdf
footprint Texas_S-PVSON-N10_ThermalVias
pins: 1 SW (power), 2 SW hidden, 3 VOUT (power), 4 VOUT hidden, 5 PG (out), 6 SS (in), 7 FB (in), 8 HYS (out), 9 EN (in), 10 VIN (power), 11 GND (power)

## TPS61252DSG
designator *  value TPS61252DSG
ki_keywords: boost converter switching; ki_description: Tiny 1.5-A Boost Converter With Adjustable Input Current Limit, 2.3-6.0V Vin, 3.0-6.5V Vout, WSON-8; ki_fp_filters: WSON*1EP*2x2mm*P0.5mm*; Footprint: Package_SON:WSON-8-1EP_2x2mm_P0.5mm_EP0.9x1.6mm; Supplier: http://www.ti.com/lit/ds/symlink/tps61252.pdf
footprint WSON-8-1EP_2x2mm_P0.5mm_EP0.9x1.6mm
pins: 1 GND (power), 2 VOUT (power), 3 FB (in), 4 ILIM (in), 5 PG (oc), 6 EN (in), 7 SW, 8 VIN (power), 9 GND hidden

## TPS61322DBZ
designator *  value TPS61322DBZ
ki_keywords: Boost converter; ki_description: 750mA Step-Up Converter, 2.2V Output Voltage, 0.9-5.5V Input Voltage, SOT-23; ki_fp_filters: SOT?23*; Footprint: Package_TO_SOT_SMD:SOT-23; Supplier: http://www.ti.com/lit/ds/symlink/tps61322.pdf
footprint SOT-23
pins: 1 GND (power), 2 SW (power), 3 VOUT (power)

## TPS62056DGS
designator *  value TPS62056DGS
ki_keywords: voltage regulator switch mode step down; ki_description: 800 mA Step-Down Converter, Adjustable Output Voltage, 0.7-6V Input Voltage, VSSOP-10; ki_fp_filters: VSSOP*3x3mm*P0.5mm*; Footprint: Package_SO:VSSOP-10_3x3mm_P0.5mm; Supplier: http://www.ti.com/lit/ds/symlink/tps62056.pdf
footprint VSSOP-10_3x3mm_P0.5mm
pins: 1 VIN (power), 2 LBO (oc), 3 GND (power), 4 PG (oc), 5 FB (in), 6 LBI (in), 7 SYNC (in), 8 EN (in), 9 SW (power), 10 PGND (power)

## TPS62125DSG
designator *  value TPS62125DSG
ki_keywords: step-down dc-dc buck regulator; ki_description: 300mA Step-Down Converter with Enable Threshold and Hysteresis, adjustable output, 3-17V input voltage, WSON-8; ki_fp_filters: WSON*EP*2x2mm*P0.5mm*; Footprint: Package_SON:WSON-8-1EP_2x2mm_P0.5mm_EP0.9x1.6mm_ThermalVias; Supplier: http://www.ti.com/lit/ds/symlink/tps62125.pdf
footprint WSON-8-1EP_2x2mm_P0.5mm_EP0.9x1.6mm_ThermalVias
pins: 1 PGND (power), 2 VIN (power), 3 EN (in), 4 AGND (power), 5 FB (in), 6 VOS (in), 7 SW (out), 8 PG (oc), 9 PAD (power)

## TPS62130
designator *  value TPS62130
ki_keywords: step-down dcdc; ki_description: 3A Step-Down Converter with DCS-Control, Adjustable Output Voltage, 3-17V Input Voltage, QFN-16; ki_fp_filters: VQFN*1EP*3x3mm*P0.5mm*; Footprint: Package_DFN_QFN:VQFN-16-1EP_3x3mm_P0.5mm_EP1.68x1.68mm_ThermalVias; Supplier: http://www.ti.com/lit/ds/symlink/tps62130.pdf
footprint VQFN-16-1EP_3x3mm_P0.5mm_EP1.68x1.68mm_ThermalVias
pins: 1 SW (out), 2 SW hidden, 3 SW hidden, 4 PG (oc), 5 FB (in), 6 AGND (power), 7 FSW (in), 8 DEF (in), 9 SS/TR (in), 10 AVIN (power), 11 PVIN (power), 12 PVIN hidden, 13 EN (in), 14 VOS (in), 15 PGND (power), 16 PGND hidden, 17 EP (power)
